# Altium footprint library Miscellaneous SMD.PcbLib: 82 footprints (part 4 of 7)
Each footprint in its own frame and in the unit in brackets; x right, y up, seen from the top. Pads: shape width x height; smd on the part's side, far side on the other; paste and mask are expansions set on the pad; w line width, h text height; cw(c..) or ccw(c..) is an arc to the next point about the centre after c.
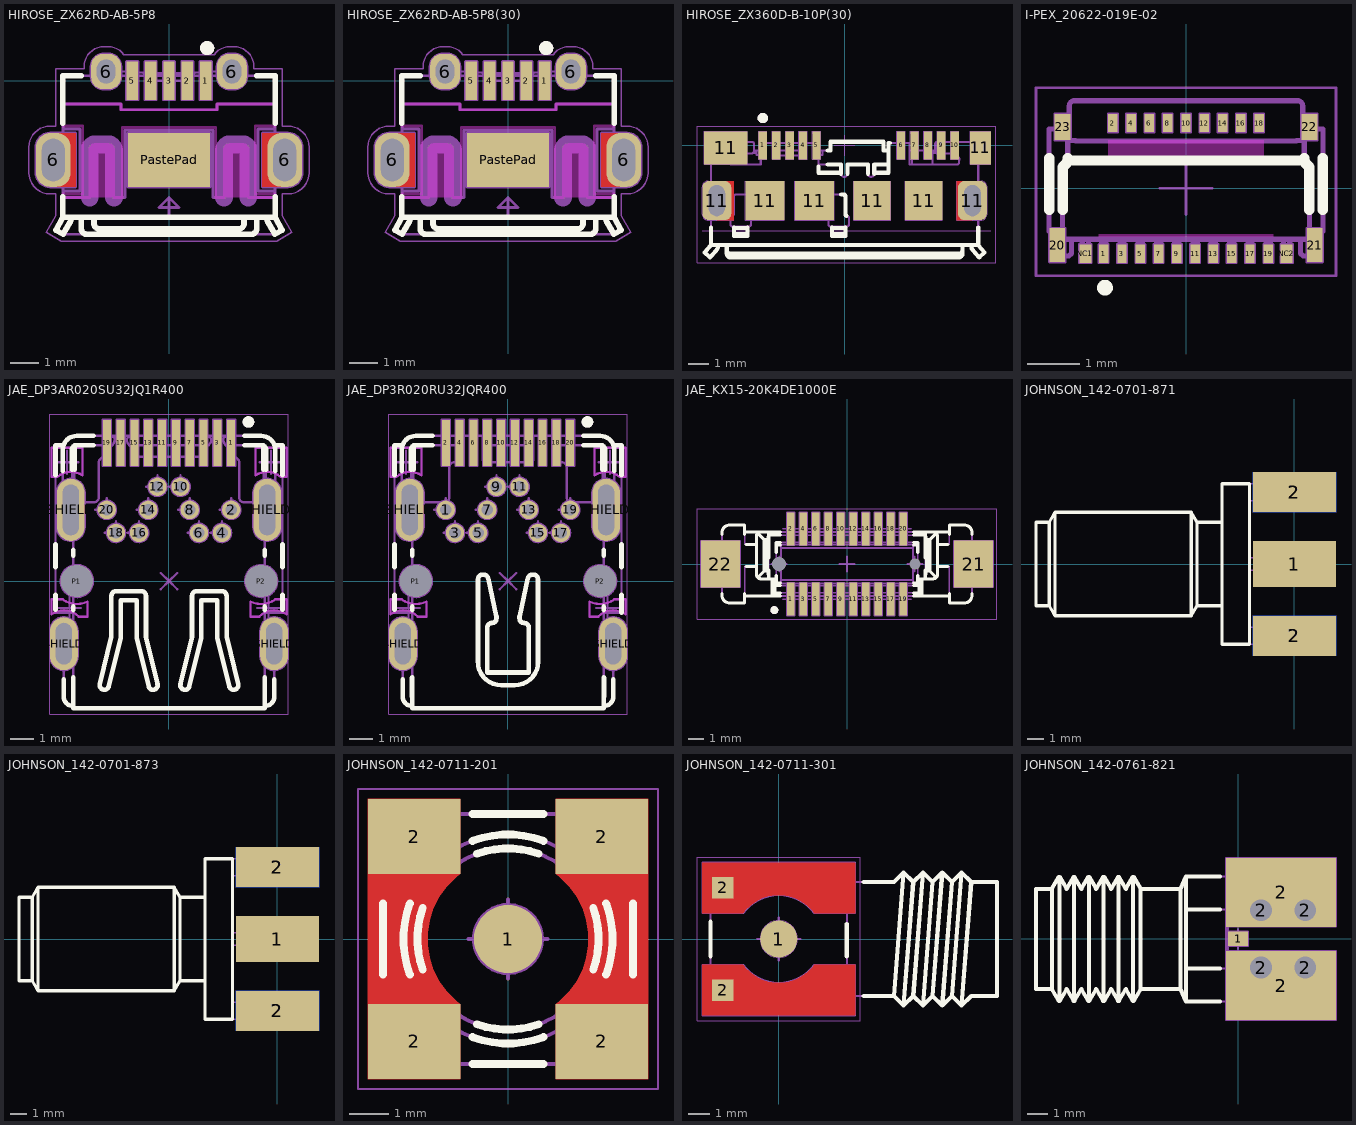
[diagram p3: the footprints below, top view; thin cyan lines are the x and y axes]

## HIROSE_ZX62RD-AB-5P8 [mm] "Right Angle, SMD Micro-USB Type AB - Reverse (Top mount), Shell Through Hole"
height 2.35
pads (10):
  rect 0.4x1.35 smd: 1(1.3,0) 2(0.65,0) 3(0,0) 4(-0.65,0) 5(-1.3,0)
  rrect80% 1.225x1.9 hole 0.8 slot 1.5 at 90 deg: 6(-4.088,-2.8) 6(4.088,-2.8)
  rrect80% 1.05x1.25 hole 0.65 slot 0.85 at 90 deg: 6(-2.225,0.325) 6(2.225,0.325)
  rect 2.9x1.9 smd: PastePad(0,-2.8)
Top Layer:
  region: 4.2,-3.75 4.2,-1.85 3.3,-1.85 3.3,-3.75
  region: -4.2,-1.85 -4.2,-3.75 -3.3,-3.75 -3.3,-1.85
Top Layer keep-out:
  lines w0.1: -3.75,-4.125 -2.8,-4.125 -2.8,-2.45 cw(c-2.6,-2.45) -2.6,-2.25 -2.15,-2.25 cw(c-2.15,-2.45) -1.95,-2.45 -1.95,-4.125 -1.65,-4.125 -1.65,-1.65 1.65,-1.65 1.65,-4.125 1.95,-4.125 1.95,-2.45 cw(c2.15,-2.45) 2.15,-2.25 2.6,-2.25 cw(c2.6,-2.45) 2.8,-2.45 2.8,-4.125 3.75,-4.125 3.75,-4 3.05,-4 3.05,-1.6 3.75,-1.6 3.75,-0.825 1.7,-0.825 1.7,-1.025 -1.7,-1.025 -1.7,-0.825 -3.75,-0.825 -3.75,-1.6 -3.05,-1.6 -3.05,-4 -3.75,-4 -3.75,-4.125
Top Overlay:
  circle w0.25: c1.35,1.15 r0.125
  lines w0.2: -3.75,-4.1 -3.75,-4.825 cw(c-3.8,-4.825) -3.757,-4.85 -4,-5.272 -3.742,-5.425 -3.497,-5 ccw(c-3.8,-4.825) -3.45,-4.825 ; -3.75,-1.5 -3.75,0.175 -3.1,0.175 ; -3.74,-4.825 3.75,-4.825 ; -3.1,-4.825 -3.1,-5.225 ccw(c-2.9,-5.225) -2.9,-5.425 2.9,-5.425 ccw(c2.9,-5.225) 3.1,-5.225 3.1,-4.825 ; -2.65,-4.825 -2.65,-5.039 ccw(c-2.45,-5.039) -2.45,-5.239 2.45,-5.239 ccw(c2.45,-5.039) 2.65,-5.039 2.65,-4.825 ; 3.1,0.175 3.75,0.175 3.75,-1.5 ; 3.45,-4.825 ccw(c3.8,-4.825) 3.497,-5 3.742,-5.425 4,-5.272 3.757,-4.85 cw(c3.8,-4.825) 3.75,-4.825 ; 3.75,-4.1 3.75,-4.825
Keep-Out Layer:
  board cut-out: -2.8,-4.125 -2.8,-2.45 -2.8,-2.41 -2.77,-2.337 -2.713,-2.28 -2.64,-2.25 -2.6,-2.25 -2.15,-2.25 -2.11,-2.25 -2.037,-2.28 -1.98,-2.337 -1.95,-2.41 -1.95,-2.45 -1.95,-4.125
  board cut-out: 1.95,-4.125 1.95,-2.45 1.95,-2.41 1.98,-2.337 2.037,-2.28 2.11,-2.25 2.15,-2.25 2.6,-2.25 2.64,-2.25 2.713,-2.28 2.77,-2.337 2.8,-2.41 2.8,-2.45 2.8,-4.125
Mechanical 1:
  lines w0.635: -2.8,-4.125 -2.8,-2.45 cw(c-2.6,-2.45) -2.6,-2.25 -2.15,-2.25 cw(c-2.15,-2.45) -1.95,-2.45 -1.95,-4.125 ; 1.95,-4.125 1.95,-2.45 cw(c2.15,-2.45) 2.15,-2.25 2.6,-2.25 cw(c2.6,-2.45) 2.8,-2.45 2.8,-4.125
Mechanical 8:
  drawing of 172 lines, arcs and shapes, not listed
  text "PCB end" at -4.3,-5.075 h0.5
Mechanical 14:
  circle w0.25: c1.35,1.15 r0.125
  lines w0.1: -3.75,-3.225 -4.325,-3.225 -4.325,-2.375 -3.75,-2.375 ; -3.74,-4.825 3.75,-4.825 ; -3.45,-4.825 cw(c-3.8,-4.825) -3.497,-5 -3.742,-5.425 -4,-5.272 -3.757,-4.85 ccw(c-3.8,-4.825) -3.75,-4.825 -3.75,0.175 3.75,0.175 3.75,-4.825 ; -3.1,-4.825 -3.1,-5.225 ccw(c-2.9,-5.225) -2.9,-5.425 2.9,-5.425 ccw(c2.9,-5.225) 3.1,-5.225 3.1,-4.825 ; -2.65,-4.825 -2.65,-5.039 ccw(c-2.45,-5.039) -2.45,-5.239 2.45,-5.239 ccw(c2.45,-5.039) 2.65,-5.039 2.65,-4.825 ; -2.45,0.175 -2.45,0.453 cw(c-2.291,-0.138) -2.3,0.474 -2.15,0.474 cw(c-2.159,-0.138) -2,0.453 -2,0.365 ccw(c-1.81,0.891) -1.845,0.333 -0.9,0.279 -0.9,0.272 ccw(c-0.741,0.862) -0.75,0.251 -0.6,0.251 ccw(c-0.606,0.659) -0.5,0.265 0.5,0.265 ccw(c0.606,0.659) 0.6,0.251 0.75,0.251 ccw(c0.741,0.862) 0.9,0.272 0.9,0.279 1.845,0.333 ccw(c1.81,0.891) 2,0.365 2,0.453 cw(c2.159,-0.138) 2.15,0.474 2.3,0.474 cw(c2.291,-0.138) 2.45,0.453 2.45,0.175 ; 3.45,-4.825 ccw(c3.8,-4.825) 3.497,-5 3.742,-5.425 4,-5.272 3.757,-4.85 cw(c3.8,-4.825) 3.75,-4.825 ; 3.75,-3.225 4.325,-3.225 4.325,-2.375 3.75,-2.375
Mechanical 15:
  lines w0.05: -4.95,-3.25 ccw(c-4.2,-3.25) -4.2,-4 -4,-4 -4,-4.771 -4.34,-5.361 -3.81,-5.675 3.81,-5.675 4.34,-5.361 4,-4.771 4,-4 4.2,-4 ccw(c4.2,-3.25) 4.95,-3.25 4.95,-2.35 ccw(c4.2,-2.35) 4.2,-1.6 4,-1.6 4,0.425 3,0.425 3,0.5 ccw(c2.3,0.5) 2.3,1.2 2.15,1.2 ccw(c2.15,0.5) 1.594,0.925 -1.594,0.925 ccw(c-2.15,0.5) -2.15,1.2 -2.3,1.2 ccw(c-2.3,0.5) -3,0.5 -3,0.425 -4,0.425 -4,-1.6 -4.2,-1.6 ccw(c-4.2,-2.35) -4.95,-2.35 -4.95,-3.25
Drill Drawing:
  lines w0.1: -1.654,-7.125 3.826,-7.125 ; -0.15,-4.125 1.65,-4.125 ; -0.15,-2.25 1.45,-2.25 ; 0.008,-5.065 0.35,-4.125 0.692,-5.065 ; 0.008,-1.31 0.35,-2.25 0.692,-1.31 ; 0.35,-5.065 0.35,-1.31 ; 1.01,-7.467 1.95,-7.125 1.01,-6.783 ; 1.555,-2.097 2.009,-2.309 ; 1.797,-1.855 2.009,-2.309 ; 1.95,-9.125 1.95,-4.625 ; 2.8,-9.125 2.8,-4.625 ; 3.74,-7.467 2.8,-7.125 3.74,-6.783 ; 4.8,-1.601 1.302,-1.601 2.009,-2.309
  text "0.85" at -1.502,-6.916 h1
  text "1.87" at -0.359,-4.311 h1
  text "r0.2" at 2.3,-1.3 h1
3D body "HIROSE_ZX62RD-AB-5P8.stp": height 2.78, standoff -0.6, extent -4.325,-5.425 4.325,0.474

## HIROSE_ZX62RD-AB-5P8(30) [mm] "Right Angle, SMD Micro-USB Type AB - Reverse (Top mount), Shell Through Hole"
height 2.35
pads (10):
  rect 0.4x1.35 smd: 1(1.3,0) 2(0.65,0) 3(0,0) 4(-0.65,0) 5(-1.3,0)
  rrect80% 1.225x1.9 hole 0.8 slot 1.5 at 90 deg: 6(-4.088,-2.8) 6(4.088,-2.8)
  rrect80% 1.05x1.25 hole 0.65 slot 0.85 at 90 deg: 6(-2.225,0.325) 6(2.225,0.325)
  rect 2.9x1.9 smd: PastePad(0,-2.8)
Top Layer:
  region: -4.2,-1.85 -4.2,-3.75 -3.3,-3.75 -3.3,-1.85
  region: 4.2,-3.75 4.2,-1.85 3.3,-1.85 3.3,-3.75
Top Layer keep-out:
  lines w0.1: -3.75,-4.125 -3.75,-4 -3.05,-4 -3.05,-1.6 -3.75,-1.6 -3.75,-0.825 -1.7,-0.825 -1.7,-1.025 1.7,-1.025 1.7,-0.825 3.75,-0.825 3.75,-1.6 3.05,-1.6 3.05,-4 3.75,-4 3.75,-4.125 2.8,-4.125 2.8,-2.45 ccw(c2.6,-2.45) 2.6,-2.25 2.15,-2.25 ccw(c2.15,-2.45) 1.95,-2.45 1.95,-4.125 1.65,-4.125 1.65,-1.65 -1.65,-1.65 -1.65,-4.125 -1.95,-4.125 -1.95,-2.45 ccw(c-2.15,-2.45) -2.15,-2.25 -2.6,-2.25 ccw(c-2.6,-2.45) -2.8,-2.45 -2.8,-4.125 -3.75,-4.125
Top Overlay:
  circle w0.25: c1.35,1.15 r0.125
  lines w0.2: -3.75,-4.1 -3.75,-4.825 cw(c-3.8,-4.825) -3.757,-4.85 -4,-5.272 -3.742,-5.425 -3.497,-5 ccw(c-3.8,-4.825) -3.45,-4.825 ; -3.75,-1.5 -3.75,0.175 -3.1,0.175 ; -3.74,-4.825 3.75,-4.825 ; -3.1,-4.825 -3.1,-5.225 ccw(c-2.9,-5.225) -2.9,-5.425 2.9,-5.425 ccw(c2.9,-5.225) 3.1,-5.225 3.1,-4.825 ; -2.65,-4.825 -2.65,-5.039 ccw(c-2.45,-5.039) -2.45,-5.239 2.45,-5.239 ccw(c2.45,-5.039) 2.65,-5.039 2.65,-4.825 ; 3.1,0.175 3.75,0.175 3.75,-1.5 ; 3.45,-4.825 ccw(c3.8,-4.825) 3.497,-5 3.742,-5.425 4,-5.272 3.757,-4.85 cw(c3.8,-4.825) 3.75,-4.825 ; 3.75,-4.1 3.75,-4.825
Keep-Out Layer:
  board cut-out: 1.95,-4.125 1.95,-2.45 1.95,-2.41 1.98,-2.337 2.037,-2.28 2.11,-2.25 2.15,-2.25 2.6,-2.25 2.64,-2.25 2.713,-2.28 2.77,-2.337 2.8,-2.41 2.8,-2.45 2.8,-4.125
  board cut-out: -2.8,-4.125 -2.8,-2.45 -2.8,-2.41 -2.77,-2.337 -2.713,-2.28 -2.64,-2.25 -2.6,-2.25 -2.15,-2.25 -2.11,-2.25 -2.037,-2.28 -1.98,-2.337 -1.95,-2.41 -1.95,-2.45 -1.95,-4.125
Mechanical 1:
  lines w0.635: -2.8,-4.125 -2.8,-2.45 cw(c-2.6,-2.45) -2.6,-2.25 -2.15,-2.25 cw(c-2.15,-2.45) -1.95,-2.45 -1.95,-4.125 ; 1.95,-4.125 1.95,-2.45 cw(c2.15,-2.45) 2.15,-2.25 2.6,-2.25 cw(c2.6,-2.45) 2.8,-2.45 2.8,-4.125
Mechanical 8:
  drawing of 172 lines, arcs and shapes, not listed
  text "PCB end" at -4.3,-5.075 h0.5
Mechanical 14:
  circle w0.25: c1.35,1.15 r0.125
  lines w0.1: -3.75,-3.225 -4.325,-3.225 -4.325,-2.375 -3.75,-2.375 ; -3.74,-4.825 3.75,-4.825 ; -3.45,-4.825 cw(c-3.8,-4.825) -3.497,-5 -3.742,-5.425 -4,-5.272 -3.757,-4.85 ccw(c-3.8,-4.825) -3.75,-4.825 -3.75,0.175 3.75,0.175 3.75,-4.825 ; -3.1,-4.825 -3.1,-5.225 ccw(c-2.9,-5.225) -2.9,-5.425 2.9,-5.425 ccw(c2.9,-5.225) 3.1,-5.225 3.1,-4.825 ; -2.65,-4.825 -2.65,-5.039 ccw(c-2.45,-5.039) -2.45,-5.239 2.45,-5.239 ccw(c2.45,-5.039) 2.65,-5.039 2.65,-4.825 ; -2.45,0.175 -2.45,0.453 cw(c-2.291,-0.138) -2.3,0.474 -2.15,0.474 cw(c-2.159,-0.138) -2,0.453 -2,0.365 ccw(c-1.81,0.891) -1.845,0.333 -0.9,0.279 -0.9,0.272 ccw(c-0.741,0.862) -0.75,0.251 -0.6,0.251 ccw(c-0.606,0.659) -0.5,0.265 0.5,0.265 ccw(c0.606,0.659) 0.6,0.251 0.75,0.251 ccw(c0.741,0.862) 0.9,0.272 0.9,0.279 1.845,0.333 ccw(c1.81,0.891) 2,0.365 2,0.453 cw(c2.159,-0.138) 2.15,0.474 2.3,0.474 cw(c2.291,-0.138) 2.45,0.453 2.45,0.175 ; 3.45,-4.825 ccw(c3.8,-4.825) 3.497,-5 3.742,-5.425 4,-5.272 3.757,-4.85 cw(c3.8,-4.825) 3.75,-4.825 ; 3.75,-3.225 4.325,-3.225 4.325,-2.375 3.75,-2.375
Mechanical 15:
  lines w0.05: -4.95,-3.25 ccw(c-4.2,-3.25) -4.2,-4 -4,-4 -4,-4.771 -4.34,-5.361 -3.81,-5.675 3.81,-5.675 4.34,-5.361 4,-4.771 4,-4 4.2,-4 ccw(c4.2,-3.25) 4.95,-3.25 4.95,-2.35 ccw(c4.2,-2.35) 4.2,-1.6 4,-1.6 4,0.425 3,0.425 3,0.5 ccw(c2.3,0.5) 2.3,1.2 2.15,1.2 ccw(c2.15,0.5) 1.594,0.925 -1.594,0.925 ccw(c-2.15,0.5) -2.15,1.2 -2.3,1.2 ccw(c-2.3,0.5) -3,0.5 -3,0.425 -4,0.425 -4,-1.6 -4.2,-1.6 ccw(c-4.2,-2.35) -4.95,-2.35 -4.95,-3.25
Drill Drawing:
  lines w0.1: -1.654,-7.125 3.826,-7.125 ; -0.15,-4.125 1.65,-4.125 ; -0.15,-2.25 1.45,-2.25 ; 0.008,-5.065 0.35,-4.125 0.692,-5.065 ; 0.008,-1.31 0.35,-2.25 0.692,-1.31 ; 0.35,-5.065 0.35,-1.31 ; 1.01,-7.467 1.95,-7.125 1.01,-6.783 ; 1.555,-2.097 2.009,-2.309 ; 1.797,-1.855 2.009,-2.309 ; 1.95,-9.125 1.95,-4.625 ; 2.8,-9.125 2.8,-4.625 ; 3.74,-7.467 2.8,-7.125 3.74,-6.783 ; 4.8,-1.601 1.302,-1.601 2.009,-2.309
  text "r0.2" at 2.3,-1.3 h1
  text "1.87" at -0.359,-4.311 h1
  text "0.85" at -1.502,-6.916 h1
3D body "HIROSE_ZX62RD-AB-5P8.stp": height 2.78, standoff -0.6, extent -4.325,-5.425 4.325,0.474

## HIROSE_ZX360D-B-10P(30) [mm] "Micro-USB 3.0 Right Angle, SMD Type B, ZX360 Series"
height 2.85
pads (18):
  rect 0.4x1.35 smd: 1(-3.965,0) 2(-3.315,0) 3(-2.665,0) 4(-2.015,0) 5(-1.365,0) 6(2.735,0) 7(3.385,0) 8(4.035,0) 9(4.685,0) 10(5.335,0)
  rrect45% 1.4x1.9 hole 0.8 slot 1.5 at 90 deg: 11(-6.195,-2.675) 11(6.195,-2.675)
  rect 2.1x1.6 smd: 11(-5.765,-0.125)
  rect 1.9x1.9 smd: 11(-3.865,-2.675) 11(-1.465,-2.675)
  rect 1.8x1.9 smd: 11(1.335,-2.675) 11(3.835,-2.675)
  rect 1x1.6 smd: 11(6.585,-0.125)
Top Layer:
  region: 6.195,-3.625 6.195,-1.725 5.435,-1.725 5.435,-3.625
  region: -6.195,-1.725 -6.195,-3.625 -5.365,-3.625 -5.365,-1.725
Top Overlay:
  circle w0.25: c-3.965,1.325 r0.125
  lines w0.2: -6.475,-3.975 -6.475,-4.825 ; -6.125,-4.825 cw(c-6.525,-4.825) -6.227,-5.092 -6.525,-5.425 -6.786,-5.192 -6.488,-4.858 ccw(c-6.525,-4.825) -6.475,-4.825 ; -5.815,-4.825 cw(c-5.815,-4.925) -5.715,-4.925 -5.715,-5.252 ccw(c-5.527,-5.237) -5.515,-5.425 5.515,-5.425 ccw(c5.527,-5.237) 5.715,-5.252 5.715,-4.925 cw(c5.815,-4.925) 5.815,-4.825 ; -5.715,-5.077 ccw(c-5.527,-5.062) -5.515,-5.25 5.515,-5.25 ccw(c5.527,-5.062) 5.715,-5.077 ; -5.365,-4.293 -4.715,-4.293 ; -5.365,-3.995 -4.715,-3.995 ; -5.365,-3.975 -5.365,-4.385 -4.715,-4.385 -4.715,-3.975 ; -1.265,-1.025 -1.265,-1.325 -0.167,-1.325 ; -0.815,-0.925 -0.167,-0.925 -0.167,-1.375 ; -0.815,-0.255 -0.69,-0.255 -0.69,0.175 1.885,0.175 1.885,-0.255 2.135,-0.255 ; -0.615,-4.293 0.035,-4.293 ; -0.615,-3.995 0.035,-3.995 ; -0.615,-3.975 -0.615,-4.385 0.035,-4.385 0.035,-3.975 ; -0.165,-2.375 -0.065,-2.375 cw(c-0.065,-2.475) 0.035,-2.475 0.035,-3.325 ccw(c0.135,-3.325) 0.085,-3.412 ; 0.133,-1.375 0.133,-0.925 1.133,-0.925 1.133,-1.375 ; 1.433,-1.375 1.433,-0.925 2.135,-0.925 ; 1.433,-1.325 2.135,-1.325 2.135,0.125 2.185,0.125 ; 6.125,-4.825 ccw(c6.525,-4.825) 6.227,-5.092 6.525,-5.425 6.786,-5.192 6.488,-4.858 cw(c6.525,-4.825) 6.475,-4.825 ; 6.475,-3.975 6.475,-4.825 ; -6.475,-4.825 6.475,-4.825
Mechanical 8:
  lines w0.05: -6.905,-4.125 7.085,-4.125 ; -6.695,-2.675 -6.195,-2.675 ; -6.265,-0.125 -5.765,-0.125 ; -6.195,-3.175 -6.195,-2.675 ; -6.195,-2.175 -6.195,-2.675 ; -5.765,-0.625 -5.765,-0.125 ; -5.765,0.375 -5.765,-0.125 ; -5.695,-2.675 -6.195,-2.675 ; -5.265,-0.125 -5.765,-0.125 ; -4.365,-2.675 -3.865,-2.675 ; -3.865,-3.175 -3.865,-2.675 ; -3.865,-2.175 -3.865,-2.675 ; -3.365,-2.675 -3.865,-2.675 ; -1.965,-2.675 -1.465,-2.675 ; -1.465,-3.175 -1.465,-2.675 ; -1.465,-2.175 -1.465,-2.675 ; -0.965,-2.675 -1.465,-2.675 ; -0.5,0 0,0 ; 0,-0.5 0,0 ; 0,0.5 0,0 ; 0.5,0 0,0 ; 0.835,-2.675 1.335,-2.675 ; 1.335,-3.175 1.335,-2.675 ; 1.335,-2.175 1.335,-2.675 ; 1.835,-2.675 1.335,-2.675 ; 3.335,-2.675 3.835,-2.675 ; 3.835,-3.175 3.835,-2.675 ; 3.835,-2.175 3.835,-2.675 ; 4.335,-2.675 3.835,-2.675 ; 5.695,-2.675 6.195,-2.675 ; 5.775,-2.675 6.615,-2.675 ; 6.085,-0.125 6.585,-0.125 ; 6.195,-3.175 6.195,-2.675 ; 6.195,-2.175 6.195,-2.675 ; 6.585,-0.625 6.585,-0.125 ; 6.585,0.375 6.585,-0.125 ; 6.695,-2.675 6.195,-2.675 ; 7.085,-0.125 6.585,-0.125 ; -4.165,0.675 -3.965,0 -3.765,0.675 ; -4.165,0.675 -4.165,-0.675 -3.765,-0.675 -3.765,0.675 ; -4.165,0.675 -3.765,0.675 ; -3.515,0.675 -3.315,0 -3.115,0.675 ; -3.515,0.675 -3.515,-0.675 -3.115,-0.675 -3.115,0.675 ; -3.515,0.675 -3.115,0.675 ; -2.865,0.675 -2.665,0 -2.465,0.675 ; -2.865,0.675 -2.865,-0.675 -2.465,-0.675 -2.465,0.675 ; -2.865,0.675 -2.465,0.675 ; -2.215,0.675 -2.015,0 -1.815,0.675 ; -2.215,0.675 -1.815,0.675 ; -2.215,0.675 -2.215,-0.675 -1.815,-0.675 -1.815,0.675 ; -1.565,0.675 -1.365,0 -1.165,0.675 ; -1.565,0.675 -1.165,0.675 ; -1.565,0.675 -1.565,-0.675 -1.165,-0.675 -1.165,0.675 ; 2.535,0.675 2.735,0 2.935,0.675 ; 2.535,0.675 2.535,-0.675 2.935,-0.675 2.935,0.675 ; 2.535,0.675 2.935,0.675 ; 3.185,0.675 3.385,0 3.585,0.675 ; 3.185,0.675 3.185,-0.675 3.585,-0.675 3.585,0.675 ; 3.185,0.675 3.585,0.675 ; 3.835,0.675 4.035,0 4.235,0.675 ; 3.835,0.675 4.235,0.675 ; 3.835,0.675 3.835,-0.675 4.235,-0.675 4.235,0.675 ; 4.485,0.675 4.685,0 4.885,0.675 ; 4.485,0.675 4.885,0.675 ; 4.485,0.675 4.485,-0.675 4.885,-0.675 4.885,0.675 ; 5.135,0.675 5.335,0 5.535,0.675 ; 5.135,0.675 5.535,0.675 ; 5.135,0.675 5.135,-0.675 5.535,-0.675 5.535,0.675 ; -6.905,-3.325 ccw(c-6.605,-3.325) -6.605,-3.625 -5.365,-3.625 -5.365,-1.725 -6.605,-1.725 ccw(c-6.605,-2.025) -6.905,-2.025 -6.905,-3.325 ; -6.815,-0.925 -4.715,-0.925 -4.715,0.675 -6.815,0.675 -6.815,-0.925 ; -6.615,-3.125 ccw(c-6.315,-3.125) -6.315,-3.425 -6.075,-3.425 ccw(c-6.075,-3.125) -5.775,-3.125 -5.775,-2.225 ccw(c-6.075,-2.225) -6.075,-1.925 -6.315,-1.925 ccw(c-6.315,-2.225) -6.615,-2.225 -6.615,-3.125 ; -4.815,-3.625 -2.915,-3.625 -2.915,-1.725 -4.815,-1.725 -4.815,-3.625 ; -2.415,-3.625 -2.415,-1.725 -0.515,-1.725 -0.515,-3.625 -2.415,-3.625 ; 0.435,-3.625 0.435,-1.725 2.235,-1.725 2.235,-3.625 0.435,-3.625 ; 2.935,-3.625 2.935,-1.725 4.735,-1.725 4.735,-3.625 2.935,-3.625 ; 5.435,-3.625 6.605,-3.625 ccw(c6.605,-3.325) 6.905,-3.325 6.905,-2.025 ccw(c6.605,-2.025) 6.605,-1.725 5.435,-1.725 5.435,-3.625 ; 5.775,-3.125 ccw(c6.075,-3.125) 6.075,-3.425 6.315,-3.425 ccw(c6.315,-3.125) 6.615,-3.125 6.615,-2.225 ccw(c6.315,-2.225) 6.315,-1.925 6.075,-1.925 ccw(c6.075,-2.225) 5.775,-2.225 5.775,-3.125 ; 6.085,-0.925 6.085,0.675 7.085,0.675 7.085,-0.925 6.085,-0.925
  text "PCB END" at -0.965,-4.936 h0.5
Mechanical 14:
  circle w0.25: c-3.965,1.325 r0.125
  lines w0.1: -6.125,-4.825 cw(c-6.525,-4.825) -6.227,-5.092 -6.525,-5.425 -6.786,-5.192 -6.488,-4.858 ccw(c-6.525,-4.825) -6.475,-4.825 ; -5.815,-4.825 cw(c-5.815,-4.925) -5.715,-4.925 -5.715,-5.252 ccw(c-5.527,-5.237) -5.515,-5.425 5.515,-5.425 ccw(c5.527,-5.237) 5.715,-5.252 5.715,-4.925 cw(c5.815,-4.925) 5.815,-4.825 ; -5.715,-5.077 ccw(c-5.527,-5.062) -5.515,-5.25 5.515,-5.25 ccw(c5.527,-5.062) 5.715,-5.077 ; -5.365,-4.293 -4.715,-4.293 ; -5.365,-3.995 -4.715,-3.995 ; -5.365,-3.915 -5.365,-4.385 -4.715,-4.385 -4.715,-3.915 ; -4.419,-0.355 -4.265,-0.355 ; -4.397,-0.255 -4.065,-0.255 ; -4.265,-0.255 -4.265,-0.455 -4.065,-0.455 ; -4.09,-0.255 -4.09,0.175 -3.84,0.175 -3.84,0.114 ; -3.44,0.114 -3.44,0.175 -3.19,0.175 -3.19,0.114 ; -3.265,-0.255 -2.065,-0.255 ; -3.265,0.114 -3.265,-0.304 ccw(c-3.065,-0.297) -3.065,-0.497 -2.265,-0.497 ccw(c-2.265,-0.297) -2.065,-0.304 -2.065,0.114 ; -2.79,0.114 -2.79,0.175 -2.54,0.175 -2.54,0.114 ; -2.14,0.114 -2.14,0.175 -1.89,0.175 -1.89,0.114 ; -1.49,0.114 -1.49,0.175 -1.24,0.175 -1.24,-0.255 ; -1.265,-0.925 -0.167,-0.925 -0.167,-1.375 ccw(c-0.017,-1.375) 0.133,-1.375 0.133,-0.925 1.133,-0.925 1.133,-1.375 ccw(c1.283,-1.375) 1.433,-1.375 1.433,-0.925 2.135,-0.925 ; -1.265,-0.455 -1.065,-0.455 -1.065,-0.255 ; -1.265,-0.255 -0.69,-0.255 -0.69,0.175 1.885,0.175 1.885,-0.255 2.135,-0.255 ; -0.615,-4.293 0.035,-4.293 ; -0.615,-3.995 0.035,-3.995 ; -0.615,-3.915 -0.615,-4.385 0.035,-4.385 0.035,-3.915 ; -0.167,-1.325 -1.265,-1.325 -1.265,0.114 -4.065,0.114 -4.065,-0.925 -5.48,-0.925 cw(c-5.48,-0.825) -5.58,-0.823 -5.577,-0.646 cw(c-5.477,-0.648) -5.522,-0.558 -5.173,-0.385 -4.473,-0.385 ccw(c-4.488,-0.295) -4.397,-0.285 -4.397,0.075 ccw(c-4.488,0.085) -4.473,0.175 -6.475,0.175 -6.475,-4.825 ; 1.433,-1.325 2.135,-1.325 2.135,0.125 3.135,0.125 3.135,-0.925 5.451,-0.925 ccw(c5.451,-0.825) 5.551,-0.827 5.554,-0.648 ccw(c5.454,-0.646) 5.499,-0.557 5.158,-0.385 4.468,-0.385 cw(c4.484,-0.295) 4.393,-0.285 4.393,0.075 cw(c4.484,0.085) 4.468,0.175 6.475,0.175 6.475,-4.825 ; 2.61,0.125 2.61,0.175 2.86,0.175 2.86,0.125 ; 3.135,-0.255 4.393,-0.255 ; 3.26,-0.925 3.26,0.175 3.51,0.175 3.51,-0.255 ; 3.91,-0.255 3.91,0.175 4.16,0.175 4.16,-0.255 ; 4.265,-0.925 4.265,-0.255 ; 4.265,-0.355 4.415,-0.355 ; 6.125,-4.825 ccw(c6.525,-4.825) 6.227,-5.092 6.525,-5.425 6.786,-5.192 6.488,-4.858 cw(c6.525,-4.825) 6.475,-4.825 ; -6.475,-4.825 6.475,-4.825 ; -5.54,-3.825 ccw(c-5.44,-3.825) -5.44,-3.925 -4.64,-3.925 ccw(c-4.64,-3.825) -4.54,-3.825 -4.54,-3.523 ccw(c-4.64,-3.523) -4.628,-3.424 cw(c-4.615,-3.325) -4.715,-3.325 -4.715,-2.475 ccw(c-4.815,-2.475) -4.815,-2.375 -5.265,-2.375 ccw(c-5.265,-2.475) -5.365,-2.475 -5.365,-3.325 cw(c-5.465,-3.325) -5.453,-3.424 ccw(c-5.44,-3.523) -5.54,-3.523 -5.54,-3.825 ; -0.79,-3.825 ccw(c-0.69,-3.825) -0.69,-3.925 0.11,-3.925 ccw(c0.11,-3.825) 0.21,-3.825 0.21,-3.523 ccw(c0.11,-3.523) 0.122,-3.424 cw(c0.135,-3.325) 0.035,-3.325 0.035,-2.475 ccw(c-0.065,-2.475) -0.065,-2.375 -0.515,-2.375 ccw(c-0.515,-2.475) -0.615,-2.475 -0.615,-3.325 cw(c-0.715,-3.325) -0.702,-3.424 ccw(c-0.69,-3.523) -0.79,-3.523 -0.79,-3.825
Mechanical 15:
  lines w0.05: -7.155,-5.675 -7.155,0.925 7.335,0.925 7.335,-5.675 -7.155,-5.675
3D body "HIROSE_ZX360D-B-10P(30).stp": height 2.88, standoff -0.67, extent -6.786,-5.425 6.786,0.175

## I-PEX_20622-019E-02 [mm] "19 Contacts, Pitch 0.175mm, Surface Mount, Right Angled FPC Connector, MINIFLEX 175-ST Series"
height 1.1
pads (25):
  rect 0.18x0.35 smd: 1(-1.575,-1.25) 2(-1.4,1.25) 3(-1.225,-1.25) 4(-1.05,1.25) 5(-0.875,-1.25) 6(-0.7,1.25) 7(-0.525,-1.25) 8(-0.35,1.25) 9(-0.175,-1.25) 10(0,1.25) 11(0.175,-1.25) 12(0.35,1.25) 13(0.525,-1.25) 14(0.7,1.25) 15(0.875,-1.25) 16(1.05,1.25) 17(1.225,-1.25) 18(1.4,1.25) 19(1.575,-1.25)
  rect 0.3x0.65 smd: 20(-2.462,-1.085) 21(2.462,-1.085)
  rect 0.3x0.5 smd: 22(2.362,1.175) 23(-2.362,1.175)
  rect 0.23x0.35 smd: NC1(-1.925,-1.25) NC2(1.925,-1.25)
Top Layer keep-out:
  region: -1.665,-0.925 -1.665,-0.875 1.665,-0.875 1.665,-0.925
  region: -1.49,0.575 1.49,0.575 1.49,0.925 -1.49,0.925
Top Overlay:
  lines w0.2: -2.62,-0.41 -2.62,0.575 ; -2.362,-0.41 -2.362,0.375 cw(c-2.288,0.375) -2.333,0.435 ccw(c-2.438,0.575) -2.262,0.575 ; -2.268,0.533 2.268,0.533 ; -1.505,-1.878 ccw(c-1.55,-1.9) -1.5,-1.9 ; 2.262,0.575 ccw(c2.438,0.575) 2.333,0.435 cw(c2.288,0.375) 2.363,0.375 2.362,-0.41 ; 2.62,-0.41 2.62,0.575
Mechanical 8:
  drawing of 154 lines, arcs and shapes, not listed
Mechanical 14:
  lines w0.1: -2.362,-0.975 2.362,-0.975 ; -2.268,0.533 2.268,0.533 ; -2.262,0.957 -2.232,0.957 ; -2.193,-0.975 -2.193,-1.245 -2.242,-1.295 -2.362,-1.295 ; -2.113,0.907 2.113,0.907 ; -2.113,0.915 -2.232,0.915 -2.232,1.577 cw(c-2.134,1.578) -2.152,1.675 2.152,1.675 cw(c2.133,1.577) 2.232,1.577 2.232,0.915 2.113,0.915 ; -1.985,-0.975 -1.985,-1.325 -1.865,-1.325 -1.865,-0.975 ; -1.615,-0.975 -1.615,-1.325 -1.535,-1.325 -1.535,-0.975 ; -1.265,-0.975 -1.265,-1.325 -1.185,-1.325 -1.185,-0.975 ; -0.915,-0.975 -0.915,-1.325 -0.835,-1.325 -0.835,-0.975 ; -0.565,-1.196 -0.485,-1.196 ; -0.565,-0.975 -0.565,-1.325 -0.485,-1.325 -0.485,-0.975 ; -0.215,-1.196 -0.135,-1.196 ; -0.215,-0.975 -0.215,-1.325 -0.135,-1.325 -0.135,-0.975 ; 0.135,-0.975 0.135,-1.325 0.215,-1.325 0.215,-0.975 ; 0.485,-0.975 0.485,-1.325 0.565,-1.325 0.565,-0.975 ; 0.835,-0.975 0.835,-1.325 0.915,-1.325 0.915,-0.975 ; 1.185,-0.975 1.185,-1.325 1.265,-1.325 1.265,-0.975 ; 1.535,-0.975 1.535,-1.325 1.615,-1.325 1.615,-0.975 ; 1.865,-0.975 1.865,-1.325 1.985,-1.325 1.985,-0.975 ; 2.193,-0.975 2.193,-1.245 2.242,-1.295 2.352,-1.295 ; 2.232,0.957 2.262,0.957 ; 2.362,-0.895 2.462,-0.895 ; -2.362,-1.295 -2.462,-1.295 -2.462,-0.825 -2.62,-0.825 -2.62,1.135 -2.362,1.135 -2.362,1.325 -2.262,1.325 -2.262,0.575 cw(c-2.438,0.575) -2.333,0.435 ccw(c-2.288,0.375) -2.363,0.375 -2.362,-1.295 ; 2.262,0.575 ccw(c2.438,0.575) 2.333,0.435 cw(c2.288,0.375) 2.363,0.375 2.362,-1.295 2.462,-1.295 2.462,-0.825 2.62,-0.825 2.62,1.135 2.362,1.135 2.362,1.325 2.262,1.325 2.262,0.575
Mechanical 15:
  lines w0.05: -2.87,-1.675 2.87,-1.675 2.87,1.925 -2.87,1.925 -2.87,-1.675
3D body "I-PEX_20622-019E-02.stp": height 0.52, standoff 0, extent -2.62,-1.325 2.62,1.675
